# Altium footprint library OT Library.PcbLib: 396 footprints (part 24 of 25)
Each footprint in its own frame and in the unit in brackets; x right, y up, seen from the top. Pads: shape width x height; smd on the part's side, far side on the other; paste and mask are expansions set on the pad; w line width, h text height; cw(c..) or ccw(c..) is an arc to the next point about the centre after c.
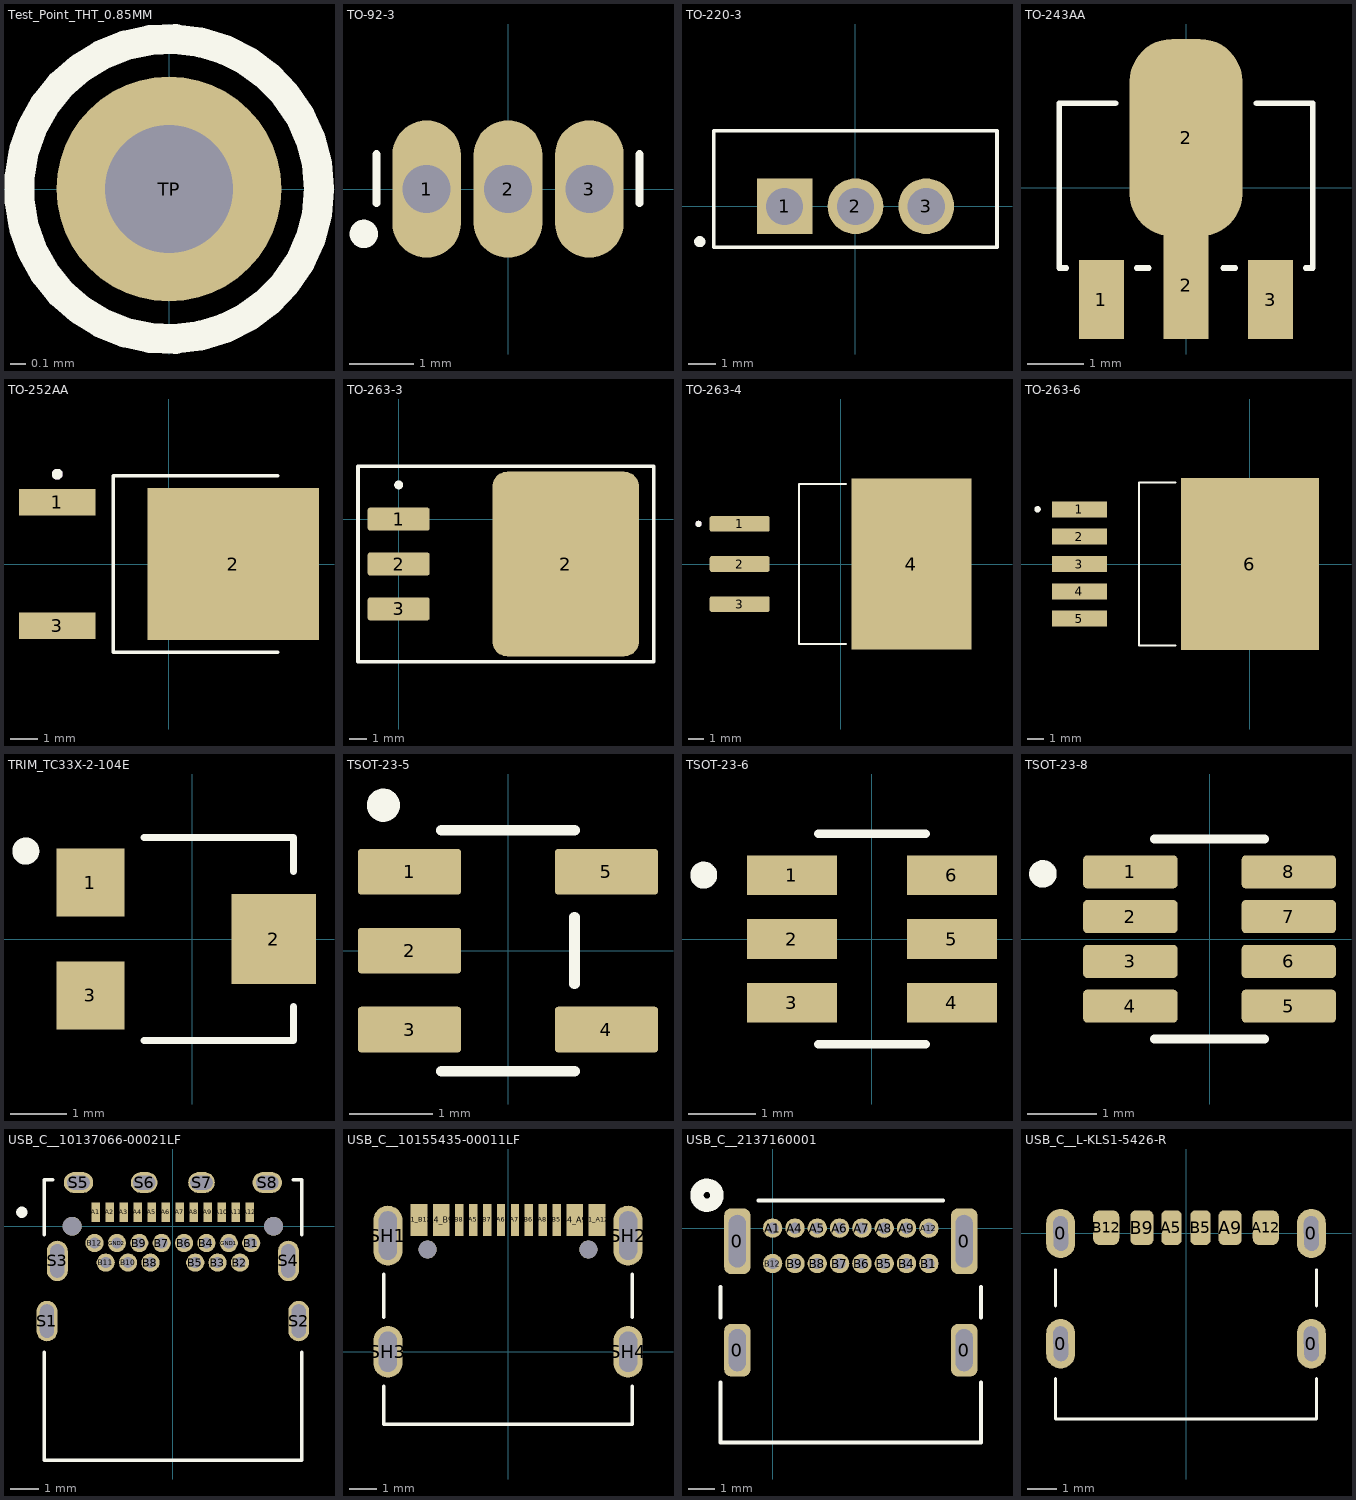
[diagram p23: the footprints below, top view; thin cyan lines are the x and y axes]

## Test_Point_THT_0.85MM [mm] "0.85mm"
pads (1):
  round 1.5 hole 0.85: TP(0,0)
Top Overlay:
  circle w0.2: c0,0 r1

## TO-92-3 [mm] "TO-226-3, TO-92-3 Short Body"
pads (3):
  oval 1.07x2.14 hole 0.75: 1(-1.27,0) 2(0,0) 3(1.27,0)
Top Overlay:
  circle w0.3: c-2.25,-0.7 r0.071
  lines w0.127: -2.05,-0.22 -2.05,0.543 ; 2.05,-0.22 2.05,0.543
3D body: height 5.05, standoff -13.7, extent -2,-0.95 2,0.57

## TO-220-3 [mm] "TO-220AB"
pads (3):
  rect 2x2 / inner round 2 / far side rect 2x2 hole 1.33: 1(-2.54,0)
  round 2 hole 1.33: 2(0,0) 3(2.54,0)
Top Overlay:
  circle w0.2: c-5.588,-1.27 r0.1
  lines w0.127: -5.08,-1.477 5.08,-1.477 5.08,2.718 -5.08,2.718 -5.08,-1.477
3D body: height 20.57, standoff -10.67, extent -5.08,-1.473 5.08,2.718

## TO-243AA [mm] "SOT-89-3"
pads (4):
  rect 0.8x1.4 smd: 1(-1.499,-1.981) 3(1.499,-1.981)
  rect 0.8x1.9 smd: 2(0,-1.727)
  rrect75% 2x3.5 smd paste-3: 2(0,0.889)
Top Overlay:
  lines w0.1: -2.125,-1.422 -2.25,-1.422 -2.25,1.5 -1.25,1.5 ; -0.875,-1.422 -0.663,-1.422 ; 0.663,-1.422 0.875,-1.422 ; 1.25,1.5 2.25,1.5 2.25,-1.422 2.125,-1.422
3D body: height 1.65, standoff 0, extent -2.299,-2.404 2.299,1.838

## TO-252AA [mm] "TO-252-3, DPAK (2 Leads + Tab), SC-63"
pads (3):
  rect 2.83x0.97 smd: 1(-4.14,2.29) 3(-4.14,-2.29)
  rect 6.35x5.63 smd paste-4: 2(2.38,0)
Top Overlay:
  circle w0.2: c-4.14,3.325 r0.1
  lines w0.127: 4.03,-3.27 -2.065,-3.27 -2.065,3.27 4.03,3.27
Top Paste:
  region: 5.195,-2.27 3.805,-2.27 3.805,-0.55 5.195,-0.55
  region: 0.955,-2.27 -0.435,-2.27 -0.435,-0.55 0.955,-0.55
  region: 3.075,-2.27 1.685,-2.27 1.685,-0.55 3.075,-0.55
  region: 5.195,0.55 3.805,0.55 3.805,2.27 5.195,2.27
  region: 0.955,0.55 -0.435,0.55 -0.435,2.27 0.955,2.27
  region: 3.075,0.55 1.685,0.55 1.685,2.27 3.075,2.27
3D Top:
  circle w0.2: c-4.14,3.325 r0.1
3D body: height 2.39, standoff -0.13, extent -4.952,-3.27 4.952,3.27

## TO-263-3 [mm] "10.16 mm × 9.01 mm"
height 4.83
pads (4):
  rrect20% 3.5x1.3 smd: 1(0,0) 2(0,-2.54) 3(0,-5.08)
  rrect20% 8.3x10.45 smd: 2(9.45,-2.54)
Top Overlay:
  circle w0.25: c0,1.935 r0.125
  lines w0.2: -2.3,-8.08 -2.3,3 14.43,3 14.43,-8.08 -2.3,-8.08
Courtyard Top:
  lines w0.1: 5.5,-2.54 6.5,-2.54 ; 6,-3.04 6,-2.04
3D body: height 4.88, standoff 0.08, extent -1.675,-7.54 13.995,2.46

## TO-263-4 [mm] "D2PAK (3 Leads + Tab), TO-263AA, TO-263 (DDPAK-3)"
pads (4):
  rrect25% 3.79x0.99 smd: 1(-6.4,2.54) 2(-6.4,0) 3(-6.4,-2.54)
  rect 7.62x10.84 smd paste-6: 4(4.48,0)
Top Overlay:
  circle w0.2: c-9,2.54 r0.1
  lines w0.127: 0.35,-5.08 -2.648,-5.08 -2.648,5.08 0.35,5.08
Top Paste:
  region: 5.205,0.27 3.755,0.27 3.755,1.53 5.205,1.53
  region: 5.205,2.07 3.755,2.07 3.755,3.33 5.205,3.33
  region: 5.205,3.87 3.755,3.87 3.755,5.13 5.205,5.13
  region: 5.205,-1.53 3.755,-1.53 3.755,-0.27 5.205,-0.27
  region: 5.205,-3.33 3.755,-3.33 3.755,-2.07 5.205,-2.07
  region: 5.205,-5.13 3.755,-5.13 3.755,-3.87 5.205,-3.87
  region: 7.745,0.27 6.295,0.27 6.295,1.53 7.745,1.53
  region: 7.745,2.07 6.295,2.07 6.295,3.33 7.745,3.33
  region: 7.745,3.87 6.295,3.87 6.295,5.13 7.745,5.13
  region: 7.745,-1.53 6.295,-1.53 6.295,-0.27 7.745,-0.27
  region: 7.745,-3.33 6.295,-3.33 6.295,-2.07 7.745,-2.07
  region: 7.745,-5.13 6.295,-5.13 6.295,-3.87 7.745,-3.87
  region: 2.665,0.27 1.215,0.27 1.215,1.53 2.665,1.53
  region: 2.665,2.07 1.215,2.07 1.215,3.33 2.665,3.33
  region: 2.665,3.87 1.215,3.87 1.215,5.13 2.665,5.13
  region: 2.665,-1.53 1.215,-1.53 1.215,-0.27 2.665,-0.27
  region: 2.665,-3.33 1.215,-3.33 1.215,-2.07 2.665,-2.07
  region: 2.665,-5.13 1.215,-5.13 1.215,-3.87 2.665,-3.87
3D Top:
  circle w0.2: c-9,2.54 r0.1
3D body: height 4.83, standoff -0.25, extent -7.62,-5.08 7.62,5.08

## TO-263-6 [mm] "DDPAK/TO-263-5"
pads (6):
  rect 3.4x1 smd paste-3 mask+0: 1(-10.6,3.4) 2(-10.6,1.7) 3(-10.6,0) 4(-10.6,-1.7) 5(-10.6,-3.4)
  rect 8.6x10.7 smd paste-6 mask+0: 6(0,0)
Top Overlay:
  circle w0.2: c-13.2,3.4 r0.1
  lines w0.127: -4.62,-5.08 -6.905,-5.08 -6.905,5.08 -4.62,5.08
Top Paste:
  region: -8.95,-3.85 -12.25,-3.85 -12.25,-2.95 -8.95,-2.95
  region: -8.95,-2.15 -12.25,-2.15 -12.25,-1.25 -8.95,-1.25
  region: -8.95,2.95 -12.25,2.95 -12.25,3.85 -8.95,3.85
  region: -8.95,1.25 -12.25,1.25 -12.25,2.15 -8.95,2.15
  region: -8.95,-0.45 -12.25,-0.45 -12.25,0.45 -8.95,0.45
  region: 4.25,-5.3 -4.25,-5.3 -4.25,5.3 4.25,5.3
Top Solder:
  region: -8.83,-3.97 -12.37,-3.97 -12.37,-2.83 -8.83,-2.83
  region: -8.83,-2.27 -12.37,-2.27 -12.37,-1.13 -8.83,-1.13
  region: -8.83,2.83 -12.37,2.83 -12.37,3.97 -8.83,3.97
  region: -8.83,1.13 -12.37,1.13 -12.37,2.27 -8.83,2.27
  region: -8.83,-0.57 -12.37,-0.57 -12.37,0.57 -8.83,0.57
  region: 4.37,-5.42 -4.37,-5.42 -4.37,5.42 4.37,5.42
3D body: height 4.65, standoff -0.15, extent -11.175,-5.08 3.176,5.08

## TRIM_TC33X-2-104E [mm]
pads (3):
  rect 1.2x1.2 smd: 1(-1.8,1) 3(-1.8,-1)
  rect 1.5x1.6 smd: 2(1.45,0)
Top Overlay:
  circle w0.24: c-2.946,1.558 r0.12
  lines w0.127: -0.85,-1.8 1.8,-1.8 1.8,-1.2 ; -0.85,1.8 1.8,1.8 1.8,1.2
3D body: height 1.1, standoff -0.1, extent -2.154,-1.5 1.646,1.5

## TSOT-23-5 [mm] "SOT-23-5 Thin, TSOT-23-5"
pads (5):
  rrect14% 1.24x0.55 smd: 1(-1.185,0.95) 2(-1.185,0) 3(-1.185,-0.95) 4(1.185,-0.95) 5(1.185,0.95)
Top Overlay:
  circle w0.2: c-1.5,1.75 r0.1
  lines w0.127: -0.8,-1.45 0.8,-1.45 ; -0.8,1.45 0.8,1.45 ; 0.8,-0.4 0.8,0.4
3D body: height 0.9, standoff 0, extent -1.4,-1.46 1.4,1.46

## TSOT-23-6 [mm] "SOT-23-6 Thin, TSOT-23-6"
pads (6):
  rect 1.34x0.59 smd: 1(-1.19,0.95) 2(-1.19,0) 3(-1.19,-0.95) 4(1.19,-0.95) 5(1.19,0) 6(1.19,0.95)
Top Overlay:
  circle w0.2: c-2.5,0.95 r0.1
  lines w0.127: -0.8,-1.565 0.8,-1.565 ; -0.8,1.565 0.8,1.565
3D body: height 1, standoff 0, extent -1.4,-1.45 1.4,1.45

## TSOT-23-8 [mm] "SOT-23-8 Thin, TSOT-23-8"
pads (8):
  rrect25% 1.37x0.48 smd paste+0 mask+0.102: 1(-1.15,0.975) 2(-1.15,0.325) 3(-1.15,-0.325) 4(-1.15,-0.975) 5(1.15,-0.975) 6(1.15,-0.325) 7(1.15,0.325) 8(1.15,0.975)
Top Overlay:
  circle w0.2: c-2.42,0.945 r0.1
  lines w0.127: -0.8,-1.45 0.8,-1.45 ; -0.8,1.45 0.8,1.45
3D body: height 1.1, standoff 0, extent -1.4,-1.448 1.4,1.452

## USB_C__10137066-00021LF [mm]
height 3.18
pads (36):
  rect 0.3x0.7 smd: A1(-2.75,0.5) A2(-2.25,0.5) A3(-1.75,0.5) A4(-1.25,0.5) A5(-0.75,0.5) A6(-0.25,0.5) A7(0.25,0.5) A8(0.75,0.5) A9(1.25,0.5) A10(1.75,0.5) A11(2.25,0.5) A12(2.75,0.5)
  round 0.65 hole 0.4: B1(2.8,-0.6) B2(2.4,-1.3) B3(1.6,-1.3) B4(1.2,-0.6) B5(0.8,-1.3) B6(0.4,-0.6) B7(-0.4,-0.6) B8(-0.8,-1.3) B9(-1.2,-0.6) B10(-1.6,-1.3) B11(-2.4,-1.3) B12(-2.8,-0.6) GND1(2,-0.6) GND2(-2,-0.6)
  oval 0.75x1.448 hole 0.5 slot 1.2 at 90 deg: S1(-4.5,-3.39) S2(4.5,-3.39) S3(-4.13,-1.24) S4(4.13,-1.24)
  oval 1.05x0.75 hole 0.5 slot 0.8 at 0 deg: S5(-3.375,1.56) S8(3.375,1.56)
  oval 0.95x0.75 hole 0.5 slot 0.8 at 0 deg: S6(-1.025,1.56) S7(1.025,1.56)
  round 0.675 hole 0.675 unplated: ""(-3.6,0) ""(3.6,0)
Top Overlay:
  circle w0.2: c-5.4,0.5 r0.1
  lines w0.127: -4.6,-4.5 -4.6,-8.36 4.6,-8.36 4.6,-4.5 ; -4.6,-0.3 -4.6,1.66 -4.3,1.66 ; 4.3,1.66 4.6,1.66 4.6,-0.3
3D Top:
  text "PCB EDGE" at -2,-7 h0.5
3D body: height 3.17, standoff -1.41, extent -4.59,-8.382 4.59,1.638

## USB_C__10155435-00011LF [mm]
height 3.37
pads (18):
  rect 0.6x1.15 smd: A1_B12(-3.2,4.745) A4_B9(-2.4,4.745) B1_A12(3.2,4.745) B4_A9(2.4,4.745)
  rect 0.3x1.15 smd: A5(-1.25,4.745) A6(-0.25,4.745) A7(0.25,4.745) A8(1.25,4.745) B5(1.75,4.745) B6(0.75,4.745) B7(-0.75,4.745) B8(-1.75,4.745)
  oval 1.05x2.15 hole 0.65 slot 1.75 at 90 deg: SH1(-4.32,4.18) SH2(4.32,4.18)
  oval 1.05x1.85 hole 0.65 slot 1.45 at 90 deg: SH3(-4.32,0) SH4(4.32,0)
  round 0.65 hole 0.65 unplated: ""(-2.89,3.68) ""(2.89,3.68)
Top Overlay:
  lines w0.127: -4.47,-1.245 -4.47,-2.6 4.47,-2.6 4.47,-1.245 ; -4.47,1.245 -4.47,2.785 ; 4.47,1.245 4.47,2.785
3D body: height 3.26, standoff -0.9, extent -4.47,-2.6 4.47,4.998

## USB_C__2137160001 [mil]
pads (20):
  rrect50% 39.37x78.74 hole 25.59 slot 62.99 at 90 deg mask-1000: 0(-52.95,-183.07) 0(287.2,-183.07)
  rrect50% 39.37x98.43 hole 25.59 slot 78.74 at 90 deg mask-1000: 0(-52.95,-19.68) 0(287.2,-19.68)
  round 29 hole 17 mask-1000: A1(0,0) A4(33.46,0) A5(66.93,0) A6(100.39,0) A7(133.86,0) A8(167.32,0) A9(200.79,0) A12(234.25,0) B1(234.25,-53.15) B4(200.79,-53.15) B5(167.32,-53.15) B6(133.86,-53.15) B7(100.39,-53.15) B8(66.93,-53.15) B9(33.46,-53.15) B12(0,-53.15)
Top Overlay:
  circle w20: c-98.43,49.21 r15
  lines w6: -77.87,-231.85 -77.87,-321.78 312.13,-321.78 312.13,-231.85 ; -77.87,-134.3 -77.87,-87.96 ; -21.01,41.22 255.26,41.22 ; 312.13,-134.3 312.13,-87.96
Top Solder:
  drawing of 24 lines, arcs and shapes, not listed
Bottom Solder:
  drawing of 24 lines, arcs and shapes, not listed
3D body: height 134.66, standoff -37.15, extent -71.65,-314.37 307.88,38.78

## USB_C__L-KLS1-5426-R [mm]
pads (10):
  oval 1x1.7 hole 0.5 slot 1.2 at 91.2 deg: 0(-4.32,-3.8) 0(-4.32,0) 0(4.32,-3.8) 0(4.32,0)
  rrect50% 0.7x1.2 smd: A5(-0.5,0.2) B5(0.5,0.2)
  rrect50% 0.8x1.2 smd: A9(1.52,0.2) B9(-1.52,0.2)
  rrect50% 0.9x1.2 smd: A12(2.75,0.2) B12(-2.75,0.2)
Top Overlay:
  lines w0.1: -4.5,-5 -4.5,-6.4 4.5,-6.4 4.5,-5 ; -4.5,-2.5 -4.5,-1.25 ; 4.5,-2.5 4.5,-1.25
3D body: height 0.68, standoff 0.68, extent 0,-3 0,-3
3D body: height 3.26, standoff -2.15, extent -4.47,-6.45 4.47,0.45